# Altium footprint library Wurth_Elektronik_Electromechanic_Wire_to_Board_Connectors_rev16a.PCBLIB: 662 footprints (part 38 of 42)
Each footprint in its own frame and in the unit in brackets; x right, y up, seen from the top. Pads: shape width x height; smd on the part's side, far side on the other; paste and mask are expansions set on the pad; w line width, h text height; cw(c..) or ccw(c..) is an arc to the next point about the centre after c.
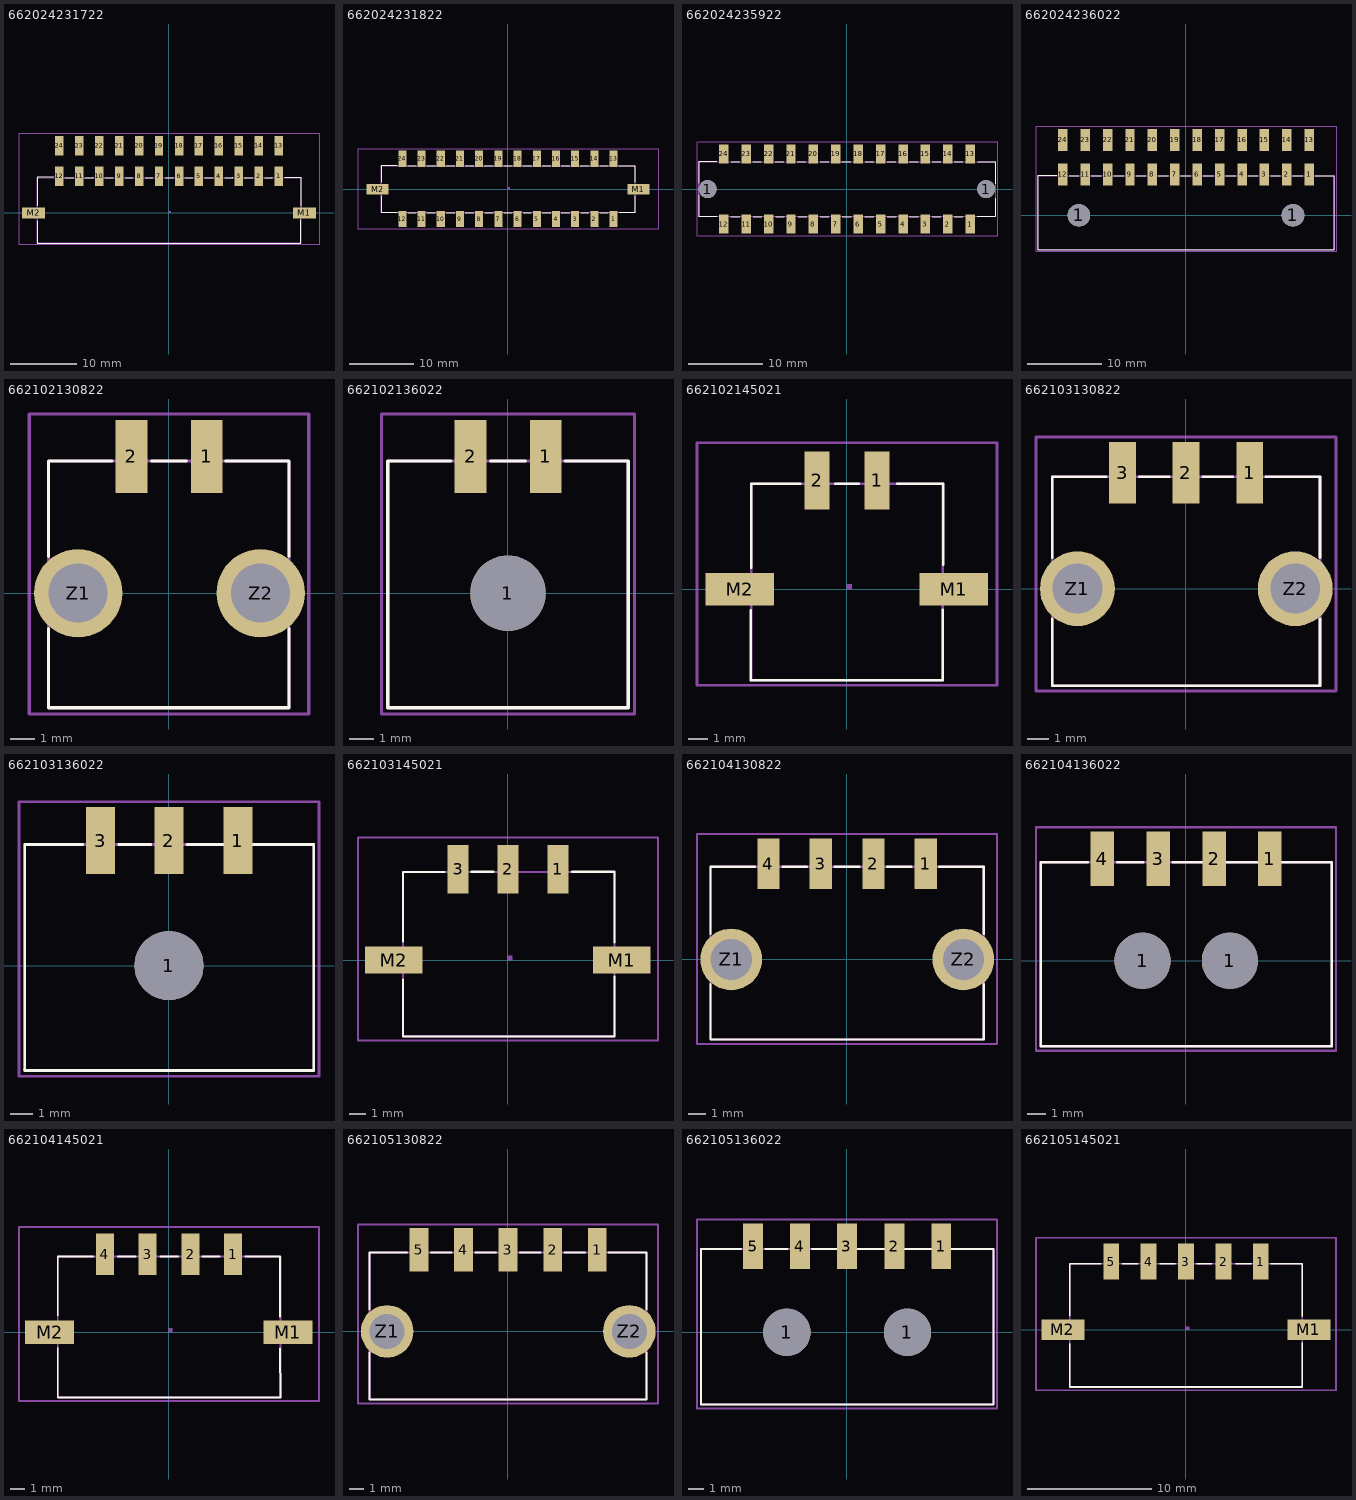
[diagram p37: the footprints below, top view; thin cyan lines are the x and y axes]

## 662024231722 [mil]
pads (26):
  rect 50x115 smd: 1(650,216) 2(532,216) 3(414,216) 4(296,216) 5(178,216) 6(60,216) 7(-59.06,216) 8(-177.17,216) 9(-295.28,216) 10(-413.39,216) 11(-531.5,216) 12(-649.61,216) 13(650,398) 14(532,398) 15(414,398) 16(296,398) 17(178,398) 18(60,398) 19(-59.06,398) 20(-177.17,398) 21(-295.28,398) 22(-413.39,398) 23(-531.5,398) 24(-649.61,398)
  rect 136x65 smd: M1(803,0) M2(-802.95,0)
Top Overlay:
  lines w5: -781.5,-46.06 -781.5,-181.1 782,-181.1 782,-42.52 ; -781.5,43 -781.5,210 -681.89,210 ; -616.93,209 -565.35,209 ; -500,209 -448.82,209 -448.82,210 ; -380.31,209 -329.92,209 ; -260.24,209 -214.96,209 ; -141.34,209 -94.88,209 ; -22.05,209 25,209 25,210 ; 94,209 141,209 ; 213,209 262,209 ; 332,209 377,209 377,210 ; 448,209 496,209 ; 567,209 613,209 613,210 ; 688,210 782,210 782,40
Mechanical 2:
  text ">NAME" at 945,71 h77.5
Mechanical 4:
  text ">VALUE" at 950,-18.31 h77.5
Mechanical 10:
  region: 0,0 10,0 10,10 0,10
Mechanical 16:
  lines w5: -781.5,-181.1 782,-181.1 782,209 -781.5,209 -781.5,-181.1
  text "1" at 625,157 h77.5
  text "24" at -668.5,332 h77.5
Mechanical 27:
  lines w5: -889.37,-190.94 890,-190.94 890,473 -889.37,473 -889.37,-190.94

## 662024231822 [mil]
pads (26):
  rect 50x100 smd: 1(650,-185.04) 2(532,-185.04) 3(414,-185.04) 4(296,-185.04) 5(178,-185.04) 6(60,-185.04) 7(-59.06,-185.04) 8(-177.17,-185.04) 9(-295.28,-185.04) 10(-413.39,-185.04) 11(-531.5,-185.04) 12(-649.61,-185.04) 13(650,186) 14(532,186) 15(414,186) 16(296,186) 17(178,186) 18(60,186) 19(-59.06,186) 20(-177.17,186) 21(-295.28,186) 22(-413.39,186) 23(-531.5,186) 24(-649.61,186)
  rect 136x65 smd: M1(803,0) M2(-802.95,0)
Top Overlay:
  lines w5: -781.5,-39.76 -781.5,-144.88 -682.28,-144.88 ; -781.5,41 -781.5,145 -682.28,145 ; -617.72,145 -563.39,145 ; -616.54,-144.88 -564.17,-144.88 ; -499.61,145 -445.28,145 ; -498.43,-144.88 -446.06,-144.88 ; -381.5,145 -327.17,145 ; -380.31,-144.88 -327.95,-144.88 ; -263.39,145 -209.06,145 ; -262.2,-144.88 -209.84,-144.88 ; -145.28,145 -90.94,145 ; -144.09,-144.88 -91.73,-144.88 ; -27.17,145 28,145 ; -25.98,-144.88 27,-144.88 ; 91,145 146,145 ; 93,-144.88 145,-144.88 ; 210,145 264,145 ; 211,-144.88 263,-144.88 ; 328,145 382,145 ; 329,-144.88 381,-144.88 ; 446,145 500,145 ; 447,-144.88 499,-144.88 ; 564,145 618,145 ; 565,-144.88 617,-144.88 ; 683,145 782,145 782,41 ; 685,-144.88 782,-144.88 782,-39.76
Mechanical 2:
  text ">NAME" at 980,38 h77.5
Mechanical 4:
  text ">VALUE" at 978,-24.41 h77.5
Mechanical 10:
  region: 0,0 10,0 10,10 0,10
  region: 0,0 10,0 10,10 0,10
  region: 0,0 10,0 10,10 0,10
  region: 0,0 10,0 10,10 0,10
  region: 0,0 10,0 10,10 0,10
  region: 0,0 10,0 10,10 0,10
  region: 0,0 10,0 10,10 0,10
  region: 0,0 10,0 10,10 0,10
  region: 0,0 10,0 10,10 0,10
  region: 0,0 10,0 10,10 0,10
  region: 0,0 10,0 10,10 0,10
  region: 0,0 10,0 10,10 0,10
  region: 0,0 10,0 10,10 0,10
  region: 0,0 10,0 10,10 0,10
  region: 0,0 10,0 10,10 0,10
  region: 0,0 10,0 10,10 0,10
  region: 0,0 10,0 10,10 0,10
  region: 0,0 10,0 10,10 0,10
  region: 0,0 10,0 10,10 0,10
  region: 0,0 10,0 10,10 0,10
  region: 0,0 10,0 10,10 0,10
  region: 0,0 10,0 10,10 0,10
  region: 0,0 10,0 10,10 0,10
Mechanical 16:
  lines w5: -781.5,-144.88 782,-144.88 782,145 -781.5,145 -781.5,-144.88
  text "1" at 637,-216.14 h77.5
  text "24" at -683.86,167 h77.5
Mechanical 27:
  lines w5: -923.23,-246.06 -923.23,247 924,247 924,-246.06 -923.23,-246.06

## 662024235922 [mil]
pads (26):
  round 95 hole 95: 1(-734.65,0) 1(735,0)
  rect 50x100 smd: 1(650,-185.04) 2(532,-185.04) 3(414,-185.04) 4(296,-185.04) 5(178,-185.04) 6(60,-185.04) 7(-59.06,-185.04) 8(-177.17,-185.04) 9(-295.28,-185.04) 10(-413.39,-185.04) 11(-531.5,-185.04) 12(-649.61,-185.04) 13(650,186) 14(532,186) 15(414,186) 16(296,186) 17(178,186) 18(60,186) 19(-59.06,186) 20(-177.17,186) 21(-295.28,186) 22(-413.39,186) 23(-531.5,186) 24(-649.61,186)
Top Overlay:
  lines w5: -781.5,-29.13 -781.5,-144.88 -687.4,-144.88 ; -781.5,32 -781.5,145 -688.19,145 ; -612.2,-144.88 -566.93,-144.88 ; -611.81,145 -566.54,145 ; -498.03,145 -452.76,145 ; -493.7,-144.88 -448.43,-144.88 ; -379.13,145 -333.86,145 ; -376.77,-144.88 -331.5,-144.88 ; -261.81,145 -216.54,145 ; -258.27,-144.88 -212.99,-144.88 ; -140.94,145 -95.67,145 ; -140.55,-144.88 -95.28,-144.88 ; -26.38,145 19,145 ; -23.62,-144.88 22,-144.88 ; 95,-144.88 141,-144.88 ; 97,145 142,145 ; 213,-144.88 259,-144.88 ; 213,145 258,145 ; 330,-144.88 376,-144.88 ; 330,145 376,145 ; 449,-144.88 495,-144.88 ; 449,145 494,145 ; 567,-144.88 612,-144.88 ; 567,145 612,145 ; 688,-144.88 782,-144.88 ; 690,145 782,145 782,28 ; 782,-144.49 782,-47.64
Mechanical 2:
  text ">NAME" at 950,50 h77.5
Mechanical 4:
  text ">VALUE" at 950,-25 h77.5
Mechanical 16:
  lines w5: -781.5,-144.88 782,-144.88 782,145 -781.5,145 -781.5,-144.88
  text "1" at 625,-200 h77.5
  text "24" at -684.06,146 h77.5
Mechanical 27:
  lines w5: -791.34,-248.03 -791.34,249 ; -785.43,-248.03 792,-248.03 792,249 -785.43,249

## 662024236022 [mil]
pads (26):
  round 119 hole 119: 1(-564.57,0) 1(565,0)
  rect 50x115 smd: 1(650,216) 2(532,216) 3(414,216) 4(296,216) 5(178,216) 6(60,216) 7(-59.06,216) 8(-177.17,216) 9(-295.28,216) 10(-413.39,216) 11(-531.5,216) 12(-649.61,216) 13(650,398) 14(532,398) 15(414,398) 16(296,398) 17(178,398) 18(60,398) 19(-59.06,398) 20(-177.17,398) 21(-295.28,398) 22(-413.39,398) 23(-531.5,398) 24(-649.61,398)
Top Overlay:
  lines w5: -681.1,209 -781.5,209 -781.5,-181.1 782,-181.1 782,209 683,209 ; -616.93,209 -565.35,209 ; -498.82,209 -447.24,209 ; -380.71,209 -329.13,209 ; -262.99,209 -211.42,209 ; -144.88,209 -93.31,209 ; -26.77,209 25,209 ; 92,209 143,209 ; 210,209 262,209 ; 328,209 380,209 ; 447,209 498,209 ; 565,209 616,209
Mechanical 2:
  text ">NAME" at 875,82 h77.5
Mechanical 4:
  text ">VALUE" at 875,7 h77.5
Mechanical 16:
  lines w5: -781.5,-181.1 782,-181.1 782,209 -781.5,209 -781.5,-181.1
  text "1" at 625,157 h77.5
  text "24" at -670.28,391 h77.5
Mechanical 27:
  lines w5: -791.34,-190.94 792,-190.94 792,469 -791.34,469 -791.34,-190.94

## 662102130822 [mil]
pads (4):
  rect 50x115 smd: 1(60,216) 2(-59.06,216)
  round 139.5 hole 93: Z1(-143.31,0) Z2(145,0)
Top Overlay:
  lines w5: -190.16,-179.53 -189.96,-179.53 ; -189.96,-56.3 -189.96,-181.1 190,-181.1 190,-56.3 ; -189.96,58 -189.96,209 -89.76,209 ; -27.56,209 28,209 ; 90,209 190,209 190,58
Mechanical 2:
  text ">Name" at -109.06,296 h77.5
Mechanical 4:
  text ">Value" at -126.38,-250.39 h77.5
Mechanical 16:
  lines w5: -189.96,-181.1 190,-181.1 190,209 -189.96,209 -189.96,-179.53
Mechanical 27:
  lines w5: -220.47,-190.94 221,-190.94 221,283 -220.47,283 -220.47,-190.94

## 662102136022 [mil]
pads (3):
  round 119 hole 119: 1(0,0)
  rect 50x115 smd: 1(60,216) 2(-59.06,216)
Top Overlay:
  lines w5: -190.16,-179.53 -189.96,-179.53 ; -89.76,209 -189.96,209 -189.96,-181.1 190,-181.1 190,209 90,209 ; -27.56,209 28,209
Mechanical 2:
  text ">Name" at -109.06,346 h77.5
Mechanical 4:
  text ">Value" at -126.38,-250.39 h77.5
Mechanical 16:
  lines w5: -189.96,-181.1 190,-181.1 190,209 -189.96,209 -189.96,-179.53
Mechanical 27:
  lines w5: -199.8,-190.94 200,-190.94 200,283 -199.8,283 -199.8,-190.94

## 662102145021 [mil]
pads (4):
  rect 50x115 smd: 1(60,216) 2(-59.06,216)
  rect 136x65 smd: M1(212,0) M2(-212.4,0)
Top Overlay:
  lines w5: -190.16,-42.13 -190.16,-181.1 190,-181.1 190,-40.55 ; -189.96,43 -189.96,209 -92.52,209 ; -22.83,209 24,209 ; 100,209 191,209 191,49
Mechanical 2:
  text ">NAME" at 350,66 h77.5
Mechanical 4:
  text ">VALUE" at 350,-9.65 h77.5
Mechanical 10:
  region: 0,0 10,0 10,10 0,10
Mechanical 16:
  lines w5: -189.96,-181.1 190,-181.1 190,209 -189.96,209 -189.96,-181.1
  text "1" at 50,166 h77.5
  text "2" at -75,166 h77.5
Mechanical 27:
  lines w5: -297.24,-190.94 298,-190.94 298,291 -297.24,291 -297.24,-190.94

## 662103130822 [mil]
pads (5):
  rect 50x115 smd: 1(119,216) 2(0,216) 3(-118.11,216)
  round 139.5 hole 93: Z1(-202.36,0) Z2(204,0)
Top Overlay:
  lines w5: -249.21,-179.53 -249.02,-179.53 ; -249.02,-56.3 -249.02,-181.1 250,-181.1 250,-56.3 ; -249.02,58 -249.02,209 -148.82,209 ; -86.61,209 -31.5,209 ; 32,209 87,209 ; 149,209 250,209 250,58
Mechanical 2:
  text ">Name" at -168.11,346 h77.5
Mechanical 4:
  text ">Value" at -185.43,-250.39 h77.5
Mechanical 16:
  lines w5: -249.02,-181.1 250,-181.1 250,209 -249.02,209 -249.02,-179.53
Mechanical 27:
  lines w5: -279.53,-190.94 280,-190.94 280,283 -279.53,283 -279.53,-190.94

## 662103136022 [mil]
pads (4):
  round 119 hole 119: 1(0,0)
  rect 50x115 smd: 1(119,216) 2(0,216) 3(-118.11,216)
Top Overlay:
  lines w5: -249.21,-179.53 -249.02,-179.53 ; -148.82,209 -249.02,209 -249.02,-181.1 250,-181.1 250,209 31,209 ; -86.61,209 -31.5,209
Mechanical 2:
  text ">Name" at -172.05,320 h77.5
Mechanical 4:
  text ">Value" at -185.43,-250.39 h77.5
Mechanical 16:
  lines w5: -249.02,-181.1 250,-181.1 250,209 -249.02,209 -249.02,-179.53
Mechanical 27:
  lines w5: -258.86,-190.94 259,-190.94 259,283 -258.86,283 -258.86,-190.94

## 662103145021 [mil]
pads (5):
  rect 50x115 smd: 1(119,216) 2(0,216) 3(-118.11,216)
  rect 136x65 smd: M1(271,0) M2(-271.46,0)
Top Overlay:
  lines w5: -249.61,-46.85 -249.21,-46.85 -249.21,-181.5 254,-181.5 254,-39.76 ; -249.21,44 -249.21,209 -150.39,209 ; -86.22,210 -33.86,210 -33.86,209 ; 153,210 254,210 254,42
Mechanical 2:
  text ">NAME" at 410,66 h77.5
Mechanical 4:
  text ">VALUE" at 410,-9.65 h77.5
Mechanical 10:
  region: 0,0 10,0 10,10 0,10
Mechanical 16:
  lines w5: -249.02,-181.1 254,-181.1 254,209 -249.02,209 -249.02,-181.1
  text "1" at 110,166 h77.5
  text "3" at -140.94,166 h77.5
Mechanical 27:
  lines w5: -356.3,-190.94 357,-190.94 357,291 -356.3,291 -356.3,-190.94

## 662104130822 [mil]
pads (6):
  rect 50x115 smd: 1(178,216) 2(60,216) 3(-59.06,216) 4(-177.17,216)
  round 139.5 hole 93: Z1(-261.42,0) Z2(263,0)
Top Overlay:
  lines w5: -308.27,-179.53 -308.07,-179.53 ; -308.07,-56.3 -308.07,-181.1 309,-181.1 309,-56.3 ; -308.07,58 -308.07,209 -207.87,209 ; -145.67,209 -90.55,209 ; -27.56,209 28,209 ; 91,209 146,209 ; 208,209 309,209 309,58
Mechanical 2:
  text ">Name" at -127.17,346 h77.5
Mechanical 4:
  text ">Value" at -144.49,-250.39 h77.5
Mechanical 16:
  lines w5: -308.07,-181.1 309,-181.1 309,209 -308.07,209 -308.07,-179.53
Mechanical 27:
  lines w5: -338.58,-190.94 339,-190.94 339,283 -338.58,283 -338.58,-190.94

## 662104136022 [mil]
pads (6):
  round 119 hole 119: 1(-92.13,0) 1(93,0)
  rect 50x115 smd: 1(178,216) 2(60,216) 3(-59.06,216) 4(-177.17,216)
Top Overlay:
  lines w5: -308.27,-179.53 -308.07,-179.53 ; -207.87,209 -308.07,209 -308.07,-181.1 309,-181.1 309,209 -28.35,209 ; -145.67,209 -90.55,209
Mechanical 2:
  text ">Name" at -231.1,320 h77.5
Mechanical 4:
  text ">Value" at -244.49,-250.39 h77.5
Mechanical 16:
  lines w5: -308.07,-181.1 309,-181.1 309,209 -308.07,209 -308.07,-179.53
Mechanical 27:
  lines w5: -317.91,-190.94 318,-190.94 318,283 -317.91,283 -317.91,-190.94

## 662104145021 [mil]
pads (6):
  rect 50x115 smd: 1(178,216) 2(60,216) 3(-59.06,216) 4(-177.17,216)
  rect 136x65 smd: M1(330,0) M2(-330.51,0)
Top Overlay:
  lines w5: -307.87,-43.7 -308.07,-181.1 309,-181.1 308,-45.67 ; -307.87,45 -307.87,209 -209.84,209 ; -141.34,209 -92.91,209 ; -23.62,209 25,209 ; 93,209 141,209 ; 212,209 308,209 308,43
Mechanical 2:
  text ">NAME" at 469,66 h77.5
Mechanical 4:
  text ">VALUE" at 469,-9.65 h77.5
Mechanical 10:
  region: 0,0 10,0 10,10 0,10
Mechanical 16:
  lines w5: -308.07,-181.1 309,-181.1 309,209 -308.07,209 -308.07,-181.1
  text "1" at 169,166 h77.5
  text "4" at -206.89,166 h77.5
Mechanical 27:
  lines w5: -415.35,-190.94 416,-190.94 416,291 -415.35,291 -415.35,-190.94

## 662105130822 [mil]
pads (7):
  rect 50x115 smd: 1(237,216) 2(119,216) 3(0,216) 4(-118.11,216) 5(-236.22,216)
  round 139.5 hole 93: Z1(-320.47,0) Z2(322,0)
Top Overlay:
  lines w5: -367.32,-179.53 -367.13,-179.53 ; -367.13,-56.3 -367.13,-181.1 368,-181.1 368,-56.3 ; -367.13,58 -367.13,209 -266.93,209 ; -204.72,209 -149.61,209 ; -86.61,209 -31.5,209 ; 32,209 87,209 ; 150,209 205,209 ; 267,209 368,209 368,58
Mechanical 2:
  text ">Name" at -136.22,346 h77.5
Mechanical 4:
  text ">Value" at -103.54,-250.39 h77.5
Mechanical 16:
  lines w5: -367.13,-181.1 368,-181.1 368,209 -367.13,209 -367.13,-179.53
Mechanical 27:
  lines w5: -397.64,-190.94 398,-190.94 398,283 -397.64,283 -397.64,-190.94

## 662105136022 [mil]
pads (7):
  round 119 hole 119: 1(-151.18,0) 1(152,0)
  rect 50x115 smd: 1(237,216) 2(119,216) 3(0,216) 4(-118.11,216) 5(-236.22,216)
Top Overlay:
  lines w5: -367.32,-179.53 -367.13,-179.53 ; -266.93,209 -367.13,209 -367.13,-181.1 368,-181.1 368,209 -87.4,209 ; -204.72,209 -149.61,209
Mechanical 2:
  text ">Name" at -140.16,320 h77.5
Mechanical 4:
  text ">Value" at -53.54,-250.39 h77.5
Mechanical 16:
  lines w5: -367.13,-181.1 368,-181.1 368,209 -367.13,209 -367.13,-179.53
Mechanical 27:
  lines w5: -376.97,-190.94 377,-190.94 377,283 -376.97,283 -376.97,-190.94

## 662105145021 [mil]
pads (7):
  rect 50x115 smd: 1(237,216) 2(119,216) 3(0,216) 4(-118.11,216) 5(-236.22,216)
  rect 136x65 smd: M1(389,0) M2(-389.57,0)
Top Overlay:
  lines w5: -368.11,-43.7 -367.13,-43.7 -367.13,-181.1 368,-181.1 368,-41.34 ; -367.13,45 -367.13,209 -270.08,209 ; -201.57,209 -153.15,209 ; -81.89,209 -33.46,209 ; 34,209 82,209 ; 158,209 206,209 ; 269,209 368,209 368,43
Mechanical 2:
  text ">NAME" at 528,66 h77.5
Mechanical 4:
  text ">VALUE" at 528,-9.65 h77.5
Mechanical 10:
  region: 0,0 10,0 10,10 0,10
  region: 0,0 10,0 10,10 0,10
  region: 0,0 10,0 10,10 0,10
  region: 0,0 10,0 10,10 0,10
  region: 0,0 10,0 10,10 0,10
Mechanical 16:
  lines w5: -367.13,-181.1 368,-181.1 368,209 -367.13,209 -367.13,-181.1
  text "1" at 228,166 h77.5
  text "5" at -247.83,166 h77.5
Mechanical 27:
  lines w5: -474.41,-190.94 475,-190.94 475,291 -474.41,291 -474.41,-190.94